# Altium footprint library LSCB.PcbLib: 64 footprints (part 4 of 4)
Each footprint in its own frame and in the unit in brackets; x right, y up, seen from the top. Pads: shape width x height; smd on the part's side, far side on the other; paste and mask are expansions set on the pad; w line width, h text height; cw(c..) or ccw(c..) is an arc to the next point about the centre after c.
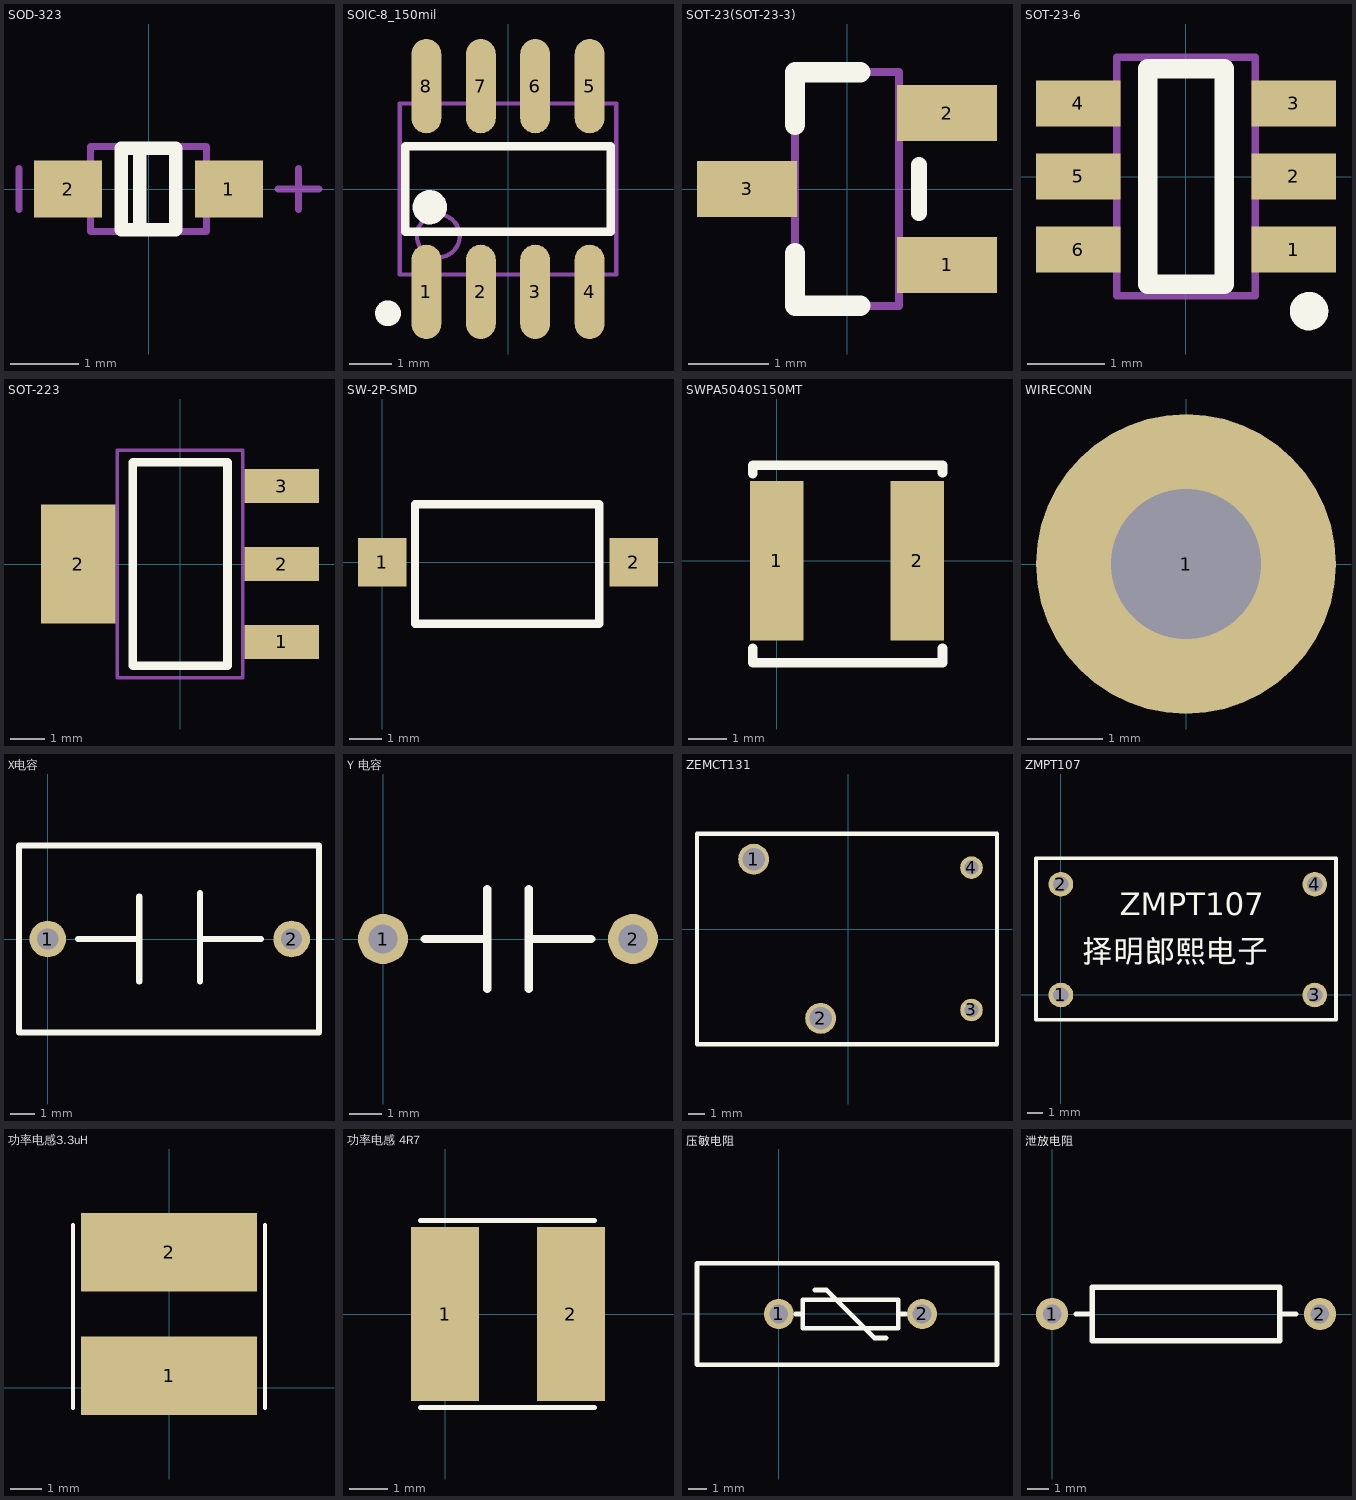
[diagram p3: the footprints below, top view; thin cyan lines are the x and y axes]

## SOD-323 [mm]
pads (2):
  rect 1x0.83 smd: 1(1.18,0) 2(-1.18,0)
Top Overlay:
  lines w0.2: -0.13,-0.6 -0.13,0.6 ; -0.4,-0.6 0.4,-0.6 0.4,0.6 -0.4,0.6 -0.4,-0.6
Mechanical 13:
  lines w0.1: -0.85,-0.625 0.85,-0.625 0.85,0.625 -0.85,0.625 -0.85,-0.625
Mechanical 15:
  lines w0.1: -1.9,-0.3 -1.9,0.3 ; 1.9,0 2.5,0 ; 2.2,-0.3 2.2,0.3
3D body "SOD323.STEP": height 1.1, standoff 0, extent -1.35,-0.625 1.35,0.625

## SOIC-8_150mil [mm]
pads (8):
  oval 0.7x2.2 smd: 1(-1.905,-2.4) 2(-0.635,-2.4) 3(0.635,-2.4) 4(1.905,-2.4) 5(1.905,2.4) 6(0.635,2.4) 7(-0.635,2.4) 8(-1.905,2.4)
Top Overlay:
  circle w0.4: c-1.825,-0.425 r0.2
  circle w0.3: c-2.8,-2.9 r0.15
  lines w0.2: -2.4,-1 -2.4,1 2.4,1 2.4,-1 -2.4,-1
Mechanical 13:
  circle w0.1: c-1.625,-1.095 r0.5
  lines w0.1: -2.525,-1.995 -2.525,1.995 2.525,1.995 2.525,-1.995 -2.525,-1.995
3D body "SOIC-8-150.SLDPRT": height 1.7, standoff -0.05, extent -2.5,-3.1 2.5,3.1

## SOT-23(SOT-23-3) [mm]
pads (3):
  rect 1.25x0.7 smd: 1(1.25,-0.95) 2(1.25,0.95) 3(-1.25,0)
Top Overlay:
  lines w0.2: 0.9,-0.3 0.9,0.3
  lines w0.254: -0.65,-0.8 -0.65,-1.46 0.165,-1.46 ; 0.165,1.46 -0.65,1.46 ; -0.65,0.8 -0.65,1.46 ; -0.65,0.8 -0.65,1.46 ; -0.65,0.8 -0.65,1.46
Mechanical 13:
  lines w0.1: -0.65,-1.46 -0.65,1.46 ; -0.65,-1.46 0.65,-1.46 ; -0.65,-1.46 -0.65,1.46 ; -0.65,-1.46 0.65,-1.46 ; -0.65,-1.46 0.65,-1.46 ; -0.65,-1.46 -0.65,1.46 ; -0.65,1.46 0.65,1.46 ; -0.65,1.46 0.65,1.46 ; -0.65,1.46 0.65,1.46 ; 0.65,-1.46 0.65,1.46 ; 0.65,-1.46 0.65,1.46 ; 0.65,-1.46 0.65,1.46
3D body "SOT-23.step": height 1.3, standoff 0, extent -1.5,-1.5 1.5,1.5

## SOT-23-6 [mm]
pads (6):
  rect 1.1x0.6 smd: 1(1.4,-0.95) 2(1.4,0) 3(1.4,0.95) 4(-1.4,0.95) 5(-1.4,0) 6(-1.4,-0.95)
Top Overlay:
  circle w0.25: c1.6,-1.75 r0.125
  lines w0.254: -0.5,-1.4 0.5,-1.4 0.5,1.4 -0.5,1.4 -0.5,-1.4
Mechanical 13:
  lines w0.1: -0.9,-1.55 0.9,-1.55 0.9,1.55 -0.9,1.55 -0.9,-1.55
3D body: height 0.25, standoff 0, extent -0.889,0.635 -0.889,0.635
3D body "User Library-SOT-23-6.SLDPRT": height 1.09, standoff 0, extent -1.283,-1.397 1.143,1.397
3D body: height 0.25, standoff 0, extent -1.905,1.397 -1.905,1.397

## SOT-223 [mm]
pads (4):
  rect 2.2x1 smd: 1(3,-2.3) 2(3,0) 3(3,2.3)
  rect 2.2x3.5 smd: 2(-3,0)
Top Overlay:
  lines w0.254: -1.4,-3 -1.4,3 1.4,3 1.4,-3 -1.4,-3
Mechanical 13:
  lines w0.1: -1.85,-3.35 1.85,-3.35 1.85,3.35 -1.85,3.35 -1.85,-3.35
3D body "TO-223.STEP": height 1.64, standoff -0.04, extent -3.49,-3.242 3.49,3.243

## SW-2P-SMD [mm]
pads (2):
  rect 1.5x1.5 smd: 1(0,0) 2(7.8,0)
Top Overlay:
  lines w0.254: 1.016,-1.905 6.731,-1.905 6.731,1.795 1.016,1.795 1.016,-1.905
3D body "轻触开关.SLDPRT": height 2.5, standoff 0, extent 0.014,-1.905 8.114,1.795

## SWPA5040S150MT [mm]
height 4
pads (2):
  rect 1.4x4.2 smd: 1(0,0) 2(3.7,0)
Top Overlay:
  lines w0.254: -0.635,-2.311 -0.635,-2.692 4.314,-2.692 4.365,-2.692 4.365,-2.311 ; -0.635,2.286 -0.635,2.515 4.365,2.515 4.365,2.311

## WIRECONN [mm]
pads (1):
  round 4 hole 2: 1(0,0)

## X电容 [mil]
pads (2):
  round 60 hole 34.65: 1(0,0) 2(400,0)
Top Overlay:
  lines w10: 50,0 150,0 ; 150,-70 150,70 ; 250,-70 250,75 ; 250,0 350,0 ; 444.45,153.11 -47.24,153.11 -47.24,-153.54 444.88,-153.54 444.88,153.54
3D body "安规电容.SLDPRT": height 545.81, standoff -115.6, extent -56.81,-153.55 455,153.54

## Y 电容 [mil]
pads (2):
  round 60 hole 34.65: 1(0,0) 2(300,0)
Top Overlay:
  lines w10: 50,0 125,0 ; 125,-60 125,60 ; 175,-60 175,60 ; 175,0 250,0

## ZEMCT131 [mm]
pads (4):
  round 1.85 hole 1.35: 1(-5.634,4.191) 2(-1.634,-5.309)
  round 1.35 hole 0.85: 3(7.366,-4.809) 4(7.366,3.691)
Top Overlay:
  lines w0.254: -9.017,-6.858 -9.017,5.715 8.89,5.715 8.89,-6.858 -9.017,-6.858
3D body "ZEMCT131.SLDPRT": height 18.15, standoff -3.05, extent -9.144,-6.604 8.856,5.396

## ZMPT107 [mm]
pads (4):
  round 1.6 hole 1: 1(0,0) 2(0,7.2) 3(16.5,0) 4(16.5,7.2)
Top Overlay:
  lines w0.254: -1.619,-1.611 17.881,-1.611 17.881,8.889 -1.619,8.889 -1.619,-1.611
  text "择明郎熙电子" at 1.397,1.651 h2.5
  text "ZMPT107" at 3.81,4.699 h2.5
3D body "ZMPT107.SLDPRT": height 18.2, standoff -3, extent -1.347,-1.317 17.653,8.683

## 功率电感3.3uH [mm]
pads (2):
  rect 5.6x2.5 smd: 1(0,0.381) 2(0,4.3)
Top Overlay:
  lines w0.127: -3.048,-0.635 -3.048,5.165 ; 3.048,-0.635 3.048,5.165
3D body "3R3功率电感.SLDPRT": height 4.5, standoff 0, extent -2.51,-0.477 2.69,5.188

## 功率电感 4R7 [mm]
pads (2):
  rect 1.75x4.5 smd: 1(0,0) 2(3.25,0)
Top Overlay:
  lines w0.127: -0.635,-2.413 3.865,-2.413 ; -0.635,2.413 3.865,2.413
3D body "4R7功率电感.SLDPRT": height 3.2, standoff -0.1, extent -0.655,-1.878 3.8,2.122

## 压敏电阻 [mm]
pads (2):
  round 1.6 hole 1: 1(0,0) 2(7.62,0)
Top Overlay:
  lines w0.254: 0.889,0 1.27,0 ; 1.905,1.27 2.54,1.27 5.08,-1.27 5.715,-1.27 ; 6.35,0 6.731,0 ; -4.35,-2.7 11.6,-2.7 11.6,2.7 -4.35,2.7 -4.35,-2.7 ; 1.27,-0.762 6.35,-0.762 6.35,0.762 1.27,0.762 1.27,-0.762

## 泄放电阻 [mil]
pads (2):
  round 60 hole 34.65: 1(0,0) 2(500,0)
Top Overlay:
  lines w10: 45,0 75,0 ; 425,0 455,0 ; 75,-50 75,50 425,50 425,-50 75,-50
3D body "1m 1w res.SLDPRT": height 159.5, standoff -21.6, extent -18.48,-85 518.48,80.36